# Altium footprint library 全库.PcbLib: 967 footprints (part 8 of 61)
Each footprint in its own frame and in the unit in brackets; x right, y up, seen from the top. Pads: shape width x height; smd on the part's side, far side on the other; paste and mask are expansions set on the pad; w line width, h text height; cw(c..) or ccw(c..) is an arc to the next point about the centre after c.
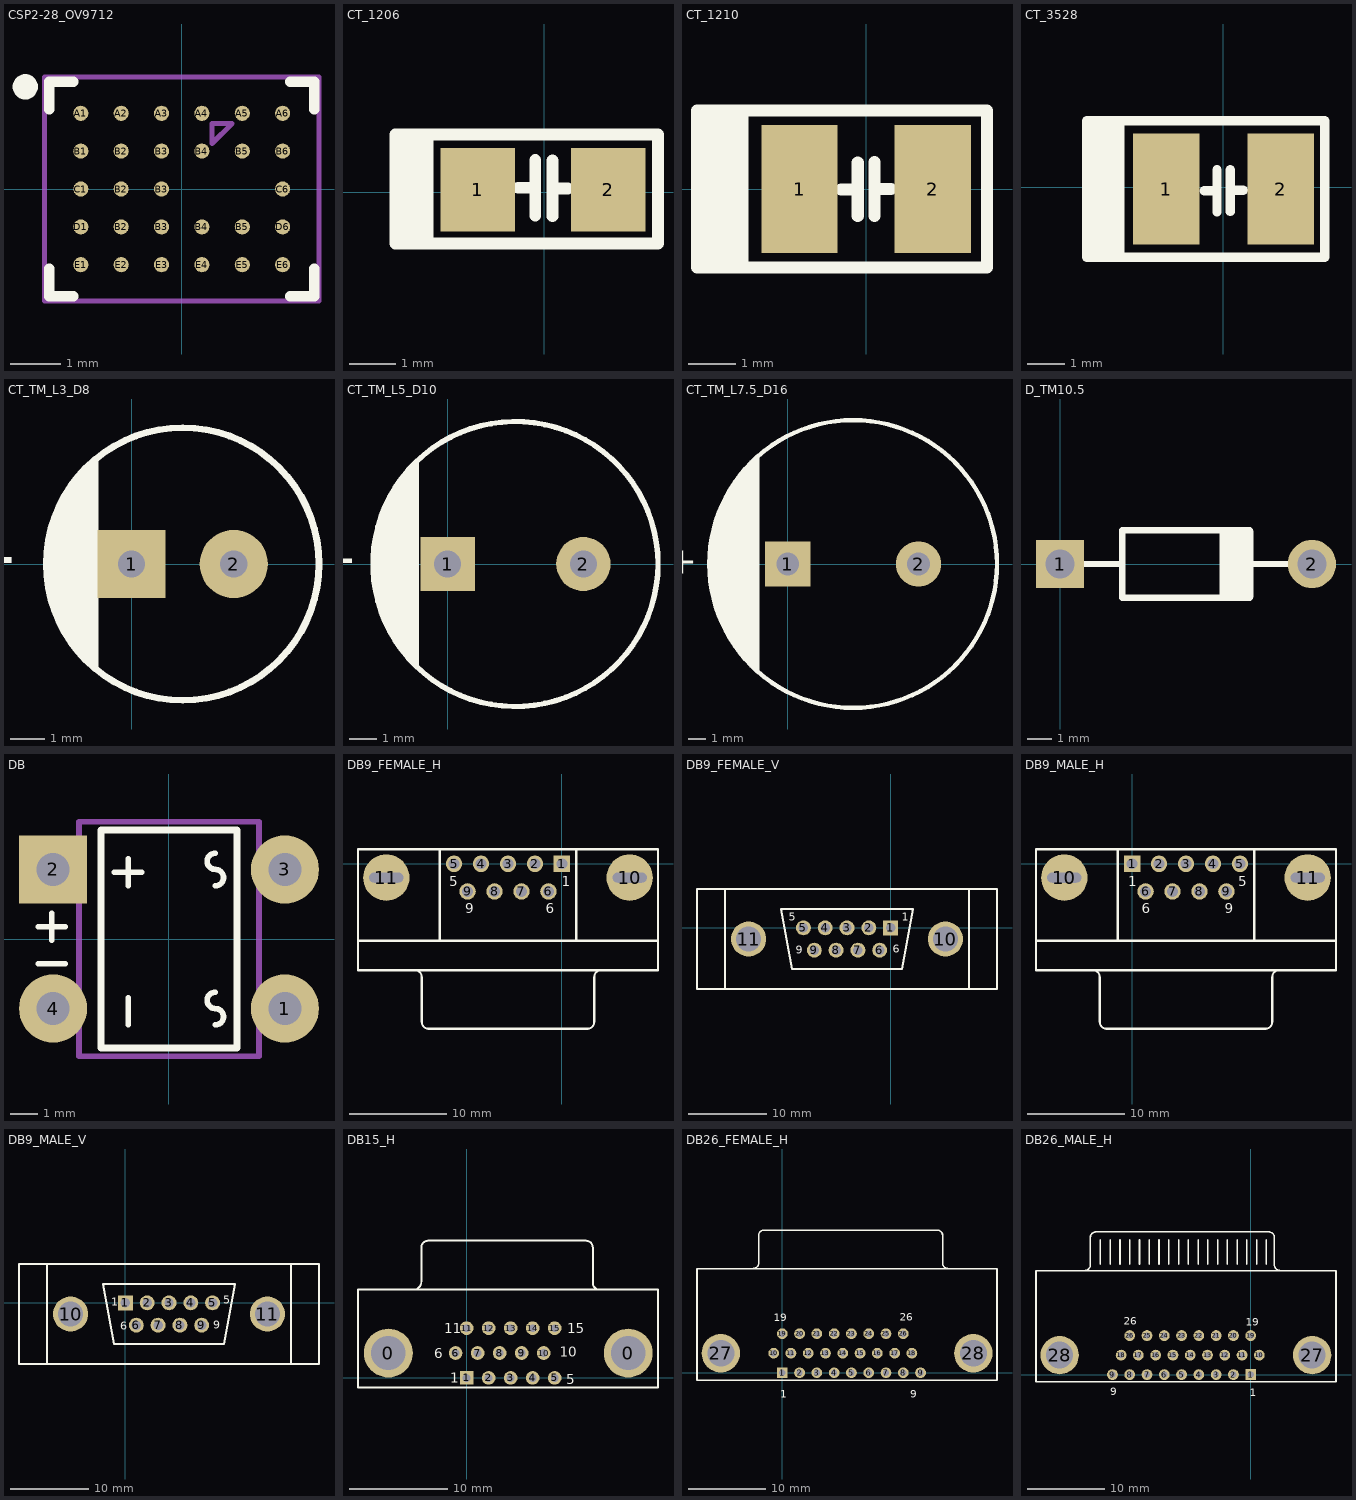
[diagram p7: the footprints below, top view; thin cyan lines are the x and y axes]

## CSP2-28_OV9712 [mm]
pads (28):
  round 0.3 smd mask+0.051: A1(-2,1.5) A2(-1.2,1.5) A3(-0.4,1.5) A4(0.4,1.5) A5(1.2,1.5) A6(2,1.5) B1(-2,0.75) B2(-1.2,-0.75) B2(-1.2,0) B2(-1.2,0.75) B3(-0.4,-0.75) B3(-0.4,0) B3(-0.4,0.75) B4(0.4,-0.75) B4(0.4,0.75) B5(1.2,-0.75) B5(1.2,0.75) B6(2,0.75) C1(-2,0) C6(2,0) D1(-2,-0.75) D6(2,-0.75) E1(-2,-1.5) E2(-1.2,-1.5) E3(-0.4,-1.5) E4(0.4,-1.5) E5(1.2,-1.5) E6(2,-1.5)
Top Overlay:
  circle w0.25: c-3.1,2.025 r0.125
  lines w0.2: -2.625,-1.575 -2.625,-2.125 -2.15,-2.125 ; -2.625,1.575 -2.625,2.125 -2.15,2.125 ; 2.15,-2.125 2.625,-2.125 2.625,-1.575 ; 2.15,2.125 2.625,2.125 2.625,1.575
Mechanical 13:
  lines w0.1: -2.72,-2.22 2.72,-2.22 2.72,2.22 -2.72,2.22 -2.72,-2.22 ; 0.6,0.9 0.6,1.3 1,1.3 0.6,0.9

## CT_1206 [mm]
pads (2):
  rect 1.6x1.8 smd: 1(-1.422,0.056) 2(1.378,0.056)
Top Overlay:
  region: -2.45,-1.1 -2.45,1.25 -3.2,1.25 -3.2,-1.1
  lines w0.254: -2.5,-1.1 -2.5,1.25 ; -0.559,0.1 -0.191,0.1 ; -0.191,-0.5 -0.191,0.7 ; 0.184,-0.513 0.184,0.687 ; 0.184,0.087 0.508,0.087 ; -3.2,-1.1 -3.2,1.25 2.45,1.25 2.45,-1.1 -3.2,-1.1

## CT_1210 [mm]
pads (2):
  rect 1.6x2.7 smd: 1(-1.4,0) 2(1.4,0)
Top Overlay:
  rectangle: -2.984,-1.651 -2.603,1.651
  lines w0.254: -3.302,-1.651 -3.302,1.651 ; -3.175,-1.524 -3.175,1.651 ; -2.603,1.587 -2.603,-1.651 ; -0.533,-0.013 -0.178,-0.013 ; -0.178,-0.572 -0.178,0.559 ; 0.178,-0.572 0.178,0.572 ; 0.178,0 0.521,0 ; -2.984,-1.651 -3.556,-1.651 -3.556,1.651 -2.984,1.651 ; -2.984,-1.651 -2.984,1.651 ; -2.984,-1.651 -2.603,-1.651 ; -2.984,1.651 2.54,1.651 2.54,-1.651 -2.603,-1.651

## CT_3528 [mm] "3.5  2.8mm"
pads (2):
  rect 1.8x3 smd: 1(-1.55,-0.05) 2(1.55,-0.05)
Top Overlay:
  region: -2.8,-1.9 -2.8,1.75 -3.7,1.75 -3.7,-1.9
  lines w0.254: -2.8,-1.9 -2.8,1.8 ; -0.516,-0.1 -0.173,-0.1 ; -0.173,-0.671 -0.173,0.472 ; 0.183,-0.659 0.183,0.472 ; 0.183,-0.087 0.538,-0.087 ; -3.7,-1.9 2.75,-1.9 2.75,1.8 -3.7,1.8 -3.7,-1.9

## CT_TM_L3_D8 [mm]
pads (2):
  rect 2x2 hole 0.8: 1(0,0)
  round 2 hole 0.8: 2(3,0)
Top Overlay:
  circle w0.2: c1.5,0 r4
  region: -1.1,3 -1.6,2.6 -1.9,2.1 -2.2,1.6 -2.4,1.1 -2.5,0.2 -2.5,-0.5 -2.3,-1.2 -2.1,-1.7 -1.8,-2.2 -1.4,-2.7 -1.1,-3
  lines w0.254: -1.1,-3 -1.1,3
  text "+" at -3.302,0.762 h1.5

## CT_TM_L5_D10 [mm]
pads (2):
  rect 2x2 hole 1: 1(0,0)
  round 2 hole 1: 2(5,0)
Top Overlay:
  circle w0.2: c2.5,0 r5.25
  lines w0.254: -2.55,-1.025 -2.525,1.05 ; -2.425,-1.5 -2.4,1.575 ; -2.275,-1.925 -2.275,1.95 ; -2.15,-2.2 -2.1,2.175 ; -2,-2.525 -2,2.475 ; -1.85,-2.725 -1.85,2.725 ; -1.725,2.925 -1.675,-3.025 ; -1.575,3.1 -1.55,-3.2 ; -1.45,3.225 -1.4,-3.375 ; -1.375,3.45 -1.325,-3.525 ; -1.275,3.55 -1.225,-3.65 ; -1.175,-3.725 -1.175,3.683
  text "+" at -3.302,0.762 h1.52

## CT_TM_L7.5_D16 [mm]
pads (2):
  rect 2.6x2.6 hole 1.3: 1(0,0)
  round 2.6 hole 1.3: 2(7.5,0)
Top Overlay:
  circle w0.254: c3.75,0 r8.25
  lines w0.254: -4.35,1.225 -4.275,-1.4 ; -4.175,1.925 -4.15,-1.875 ; -4.05,-2.375 -4.05,2.275 ; -3.925,-2.775 -3.925,2.8 ; -3.8,3.05 -3.75,-3.2 ; -3.65,3.425 -3.625,-3.45 ; -3.525,3.675 -3.475,-3.75 ; -3.375,-3.925 -3.35,4.05 ; -3.225,-4.225 -3.225,4.225 ; -3.1,-4.4 -3.05,4.475 ; -2.95,-4.65 -2.925,4.575 ; -2.825,-4.8 -2.825,4.825 ; -2.7,4.95 -2.675,-5.075 ; -2.55,5.25 -2.525,-5.2 ; -2.375,5.325 -2.35,-5.475 ; -2.225,-5.55 -2.225,5.6 ; -2.05,-5.75 -2.05,5.7 ; -1.925,-5.825 -1.9,5.9 ; -1.75,-6.1 -1.75,6.1
  text "+" at -5.207,0.762 h1.52

## D_TM10.5 [mm] "Diode, Axial; Body 5.2 x 2.7 mm (LxDia. max), Lead Dia. 0.86 mm (max)"
height 2.8
pads (2):
  rect 2x2 hole 1.2: 1(0,0)
  round 2 hole 1.2: 2(10.46,0)
Top Overlay:
  rectangle: 6.627,-1.4 8.024,1.4
  lines w0.254: 1.039,0 2.58,0 ; 7.88,-1.4 2.58,-1.4 2.58,1.4 7.88,1.4 ; 7.897,0 9.421,0

## DB [mm]
pads (4):
  round 2.5 hole 1.2: 1(4.25,-2.55) 3(4.25,2.55) 4(-4.25,-2.55)
  rect 2.5x2.5 hole 1.2: 2(-4.25,2.55)
Top Overlay:
  lines w0.203: -4.8,-0.9 -3.8,-0.9 ; -4.8,0.45 -3.8,0.45 ; -4.3,-0.05 -4.3,0.95 ; -2,2.45 -1,2.45 ; -1.5,-3.15 -1.5,-2.15 ; -1.5,1.95 -1.5,2.95 ; 1.7,-3.15 ccw(c1.7,-2.85) 1.7,-2.55 cw(c1.7,-2.25) 1.7,-1.95 ; 1.7,1.95 ccw(c1.7,2.25) 1.7,2.55 cw(c1.7,2.85) 1.7,3.15
  lines w0.254: -2.5,-4 2.5,-4 2.5,4 -2.5,4 -2.5,-4
Mechanical 13:
  lines w0.203: -3.3,-4.3 -3.3,4.3 3.3,4.3 3.3,-4.3 -3.3,-4.3

## DB9_FEMALE_H [mm]
pads (11):
  rect 1.69x1.69 hole 1.09: 1(0,0)
  round 1.69 hole 1.09: 2(-2.77,0) 3(-5.54,0) 4(-8.31,0) 5(-11.08,0) 6(-1.385,-2.84) 7(-4.155,-2.84) 8(-6.925,-2.84) 9(-9.695,-2.84)
  round 4.76 hole 1 slot 3.5 at 0 deg: 10(6.955,-1.42) 11(-18.035,-1.42)
Top Overlay:
  lines w0.2: -15.1,-10.925 cw(c-15.1,-11.62) -14.405,-11.62 ; -14.4,-16.225 ccw(c-13.705,-16.225) -13.705,-16.92 ; 2.625,-16.92 ccw(c2.625,-16.225) 3.32,-16.225 ; 3.325,-11.62 cw(c4.02,-11.62) 4.02,-10.925
  lines w0.254: -20.94,-7.92 9.86,-7.92 ; -14.405,-16.22 -14.405,-11.62 ; -13.705,-16.92 2.625,-16.92 ; -12.54,-7.92 -12.54,1.48 ; 1.46,-7.92 1.46,1.48 ; 3.325,-16.22 3.325,-11.62 ; -20.94,-10.92 9.86,-10.92 9.86,1.48 -20.94,1.48 -20.94,-10.92
  text "6" at -1.651,-5.08 h1
  text "9" at -9.906,-5.08 h1
  text "5" at -11.557,-2.286 h1
  text "1" at 0,-2.286 h1

## DB9_FEMALE_V [mil]
pads (11):
  rect 75x75 / inner round 75 / far side rect 75x75 hole 47: 1(0,0)
  round 75 hole 47: 2(-109,0) 3(-218,0) 4(-327,0) 5(-436,0) 6(-54.5,-112) 7(-163.5,-112) 8(-272.5,-112) 9(-381.5,-112)
  round 175 hole 125: 10(274,-56) 11(-710,-56)
Top Overlay:
  lines w8: -828,-306 -828,194 ; 392,-306 392,194 ; -968,-306 532,-306 532,194 -968,194 -968,-306 ; -548,94 112,94 57,-206 -493,-206 -548,94
  text "6" at 10,-125 h39.37
  text "9" at -475,-130 h39.37
  text "5" at -510,35 h39.37
  text "1" at 55,35 h39.37

## DB9_MALE_H [mm]
pads (11):
  rect 1.69x1.69 hole 1.09: 1(0,0)
  round 1.69 hole 1.09: 2(2.77,0) 3(5.54,0) 4(8.31,0) 5(11.08,0) 6(1.385,-2.84) 7(4.155,-2.84) 8(6.925,-2.84) 9(9.695,-2.84)
  round 4.76 hole 1 slot 3.5 at 0 deg: 10(-6.955,-1.42) 11(18.035,-1.42)
Top Overlay:
  lines w0.2: -4.02,-10.925 cw(c-4.02,-11.62) -3.325,-11.62 ; -3.32,-16.225 ccw(c-2.625,-16.225) -2.625,-16.92 ; 13.705,-16.92 ccw(c13.705,-16.225) 14.4,-16.225 ; 14.405,-11.62 cw(c15.1,-11.62) 15.1,-10.925
  lines w0.254: -9.86,-7.92 20.94,-7.92 ; -3.325,-16.22 -3.325,-11.62 ; -2.625,-16.92 13.705,-16.92 ; -1.46,-7.92 -1.46,1.48 ; 12.54,-7.92 12.54,1.48 ; 14.405,-16.22 14.405,-11.62 ; -9.86,-10.92 20.94,-10.92 20.94,1.48 -9.86,1.48 -9.86,-10.92
  text "6" at 1.016,-5.08 h1
  text "9" at 9.525,-5.08 h1
  text "5" at 10.922,-2.286 h1
  text "1" at -0.381,-2.286 h1

## DB9_MALE_V [mil]
pads (11):
  rect 75x75 / inner round 75 / far side rect 75x75 hole 47: 1(0,0)
  round 75 hole 47: 2(109,0) 3(218,0) 4(327,0) 5(436,0) 6(54.5,-112) 7(163.5,-112) 8(272.5,-112) 9(381.5,-112)
  round 175 hole 125: 10(-274,-56) 11(710,-56)
Top Overlay:
  lines w8: -392,-306 -392,194 ; 828,-306 828,194 ; -532,-306 968,-306 968,194 -532,194 -532,-306 ; -112,94 548,94 493,-206 -57,-206 -112,94
  text "6" at -25,-135 h39.37
  text "9" at 440,-130 h39.37
  text "5" at 490,-5 h39.37
  text "1" at -70,-15 h39.37

## DB15_H [mm]
pads (17):
  round 5 hole 3.5: 0(-8.001,2.54) 0(16.515,2.54)
  rect 1.4x1.4 hole 0.8: 1(0,0)
  round 1.4 hole 0.8: 2(2.25,0) 3(4.5,0) 4(6.75,0) 5(9,0) 6(-1.125,2.54) 7(1.125,2.54) 8(3.375,2.54) 9(5.625,2.54) 10(7.875,2.54) 11(0,5.08) 12(2.25,5.08) 13(4.5,5.08) 14(6.75,5.08) 15(9,5.08)
Top Overlay:
  lines w0.2: -5.461,9.017 ccw(c-5.461,9.851) -4.627,9.851 -4.627,13.322 cw(c-3.932,13.322) -3.932,14.017 ; -3.925,14.019 12.199,14.019 cw(c12.199,13.324) 12.894,13.324 12.894,9.712 ccw(c13.589,9.712) 13.589,9.017 ; -11.102,-0.96 19.558,-0.96 19.558,9.017 -11.102,9.017 -11.102,-0.96
  text "10" at 9.525,2.159 h1
  text "6" at -3.302,2.032 h1
  text "1" at -1.651,-0.508 h1
  text "15" at 10.287,4.572 h1
  text "11" at -2.286,4.572 h1
  text "5" at 10.16,-0.635 h1

## DB26_FEMALE_H [mm]
pads (28):
  rect 1.4x1.4 hole 0.8: 1(0,0)
  round 1.4 hole 0.8: 2(2.25,0) 3(4.5,0) 4(6.75,0) 5(9,0) 6(11.25,0) 7(13.5,0) 8(15.75,0) 9(18,0) 10(-1.125,2.54) 11(1.125,2.54) 12(3.375,2.54) 13(5.625,2.54) 14(7.875,2.54) 15(10.125,2.54) 16(12.375,2.54) 17(14.625,2.54) 18(16.875,2.54) 19(0,5.08) 20(2.25,5.08) 21(4.5,5.08) 22(6.75,5.08) 23(9,5.08) 24(11.25,5.08) 25(13.5,5.08) 26(15.75,5.08)
  round 5 hole 3.5: 27(-8.001,2.54) 28(24.876,2.54)
Top Overlay:
  lines w0.2: -3.78,13.57 ccw(c-3.78,14.265) -3.085,14.265 ; -3.085,14.285 -3.085,17.875 cw(c-2.39,17.875) -2.39,18.57 -1.39,18.57 19.17,18.57 20.17,18.57 cw(c20.17,17.875) 20.865,17.875 ; 20.865,18.065 20.865,14.265 ccw(c21.56,14.265) 21.56,13.57 ; -11.102,-0.96 -11.102,13.54 27.951,13.54 27.951,-0.96 -11.102,-0.96
  text "19" at -1.127,6.681 h1
  text "26" at 15.26,6.79 h1
  text "1" at -0.25,-3.275 h1
  text "9" at 16.655,-3.275 h1

## DB26_MALE_H [mm]
pads (28):
  rect 1.4x1.4 hole 0.8: 1(0,0)
  round 1.4 hole 0.8: 2(-2.25,0) 3(-4.5,0) 4(-6.75,0) 5(-9,0) 6(-11.25,0) 7(-13.5,0) 8(-15.75,0) 9(-18,0) 10(1.125,2.54) 11(-1.125,2.54) 12(-3.375,2.54) 13(-5.625,2.54) 14(-7.875,2.54) 15(-10.125,2.54) 16(-12.375,2.54) 17(-14.625,2.54) 18(-16.875,2.54) 19(0,5.08) 20(-2.25,5.08) 21(-4.5,5.08) 22(-6.75,5.08) 23(-9,5.08) 24(-11.25,5.08) 25(-13.5,5.08) 26(-15.75,5.08)
  round 5 hole 3.5: 27(8.001,2.54) 28(-24.876,2.54)
Top Overlay:
  lines w0.2: -21.56,13.57 ccw(c-21.56,14.265) -20.865,14.265 -20.865,18.065 ; -20.865,17.875 cw(c-20.17,17.875) -20.17,18.57 -19.17,18.57 1.39,18.57 2.39,18.57 cw(c2.39,17.875) 3.085,17.875 3.085,14.285 ; -19.558,14.351 -19.558,17.526 ; -18.288,14.351 -18.288,17.526 ; -17.018,14.351 -17.018,17.526 ; -15.748,14.351 -15.748,17.526 ; -14.478,14.351 -14.478,17.526 ; -13.208,14.351 -13.208,17.526 ; -11.938,14.351 -11.938,17.526 ; -10.668,14.351 -10.668,17.526 ; -9.398,14.351 -9.398,17.526 ; -8.128,14.351 -8.128,17.526 ; -6.858,14.351 -6.858,17.526 ; -5.588,14.351 -5.588,17.526 ; -4.318,14.351 -4.318,17.526 ; -3.048,14.351 -3.048,17.526 ; -1.778,14.351 -1.778,17.526 ; -0.508,14.351 -0.508,17.526 ; 0.762,14.351 0.762,17.526 ; 2.032,14.351 2.032,17.526 ; 3.085,14.265 ccw(c3.78,14.265) 3.78,13.57 ; -27.951,-0.96 -27.951,13.54 11.102,13.54 11.102,-0.96 -27.951,-0.96
  text "19" at -0.635,6.35 h1
  text "26" at -16.51,6.477 h1
  text "1" at -0.127,-2.794 h1
  text "9" at -18.288,-2.667 h1